# Altium integrated library WE-D-SUB_rev15a (1).intlib: 32 symbols
Pins are listed as number, name and electrical type; pins without a type are passive.

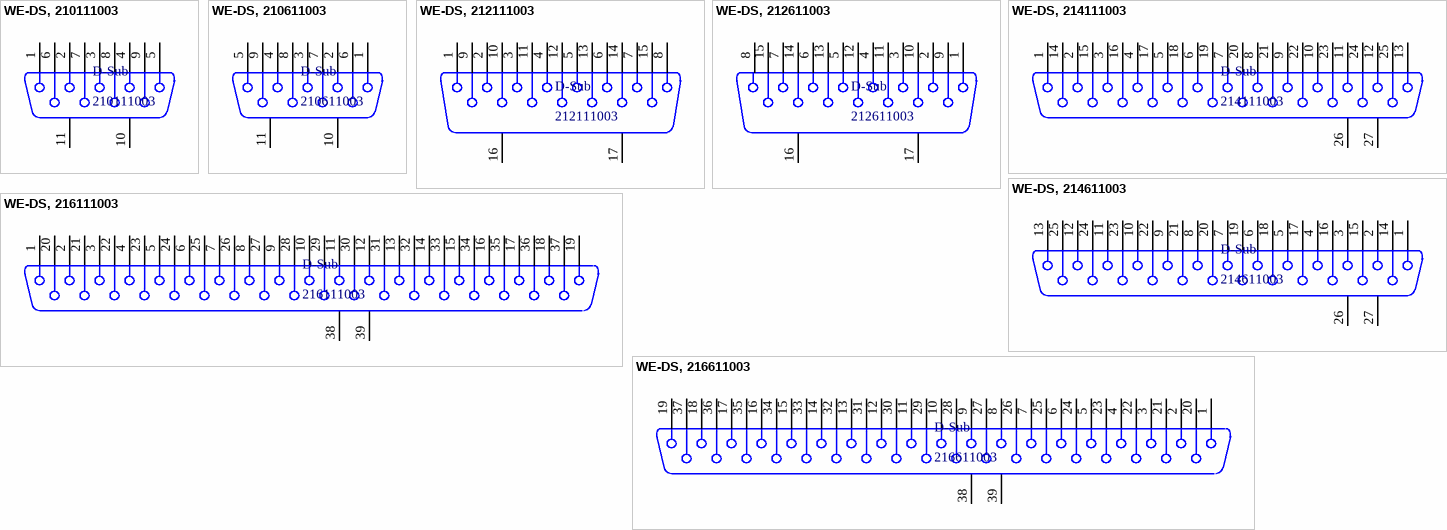
[diagram p0: symbols WE-DS, 210111003 to WE-DS, 216611003]

## WE-DS, 210111003
designator D-Sub, comment 210111003
D-SUB-Filter Connectors WE-DS, Solder Pin Straight; Manufacturer: Würth Elektronik eiSos GmbH; partNo: 210111003; ComponentLink1Description: Manufacturer; ComponentLink1URL: http://www.we-online.de; Created by: Christin Zierenner; Created Date: May 2012; ComponentLink2Description: Datasheet; ComponentLink2URL: http://katalog.we-online.de/kataloge/eisos/index.php?language=en&pf=Filter_gerade
footprint WE-DS, 210111003 (D-SUB- 9P, MALE, STRAIGHT, TH)
pins: 1, 2, 3, 4, 5, 6, 7, 8, 9, 10 MH1, 11 MH2

## WE-DS, 210611003
designator D-Sub, comment 210611003
D-SUB-Filter Connectors WE-DS, Solder Pin Straight; Manufacturer: Würth Elektronik eiSos GmbH; partNo: 210611003; ComponentLink1Description: Manufacturer; ComponentLink1URL: http://www.we-online.de; Created by: Christin Zierenner; Created Date: May 2012; ComponentLink2Description: Datasheet; ComponentLink2URL: http://katalog.we-online.de/kataloge/eisos/index.php?language=en&pf=Filter_gerade
footprint WE-DS, 210611003 (D-SUB- 9P, FEMALE, STRAIGHT, TH)
pins: 1, 2, 3, 4, 5, 6, 7, 8, 9, 10 MH1, 11 MH2

## WE-DS, 212111003
designator D-Sub, comment 212111003
D-SUB-Filter Connectors WE-DS, Solder Pin Straight; Manufacturer: Würth Elektronik eiSos GmbH; partNo: 212111003; ComponentLink1Description: Manufacturer; ComponentLink1URL: http://www.we-online.de; Created by: Christin Zierenner; Created Date: May 2012; ComponentLink2Description: Datasheet; ComponentLink2URL: http://katalog.we-online.de/kataloge/eisos/index.php?language=en&pf=Filter_gerade
footprint WE-DS, 212111003 (D-SUB- 15P, MALE, STRAIGHT, TH)
pins: 1, 2, 3, 4, 5, 6, 7, 8, 9, 10, 11, 12, 13, 14, 15, 16 MH1, 17 MH2

## WE-DS, 212611003
designator D-Sub, comment 212611003
D-SUB-Filter Connectors WE-DS, Solder Pin Straight; Manufacturer: Würth Elektronik eiSos GmbH; partNo: 212611003; ComponentLink1Description: Manufacturer; ComponentLink1URL: http://www.we-online.de; Created by: Christin Zierenner; Created Date: May 2012; ComponentLink2Description: Datasheet; ComponentLink2URL: http://katalog.we-online.de/kataloge/eisos/index.php?language=en&pf=Filter_gerade
footprint WE-DS, 212611003 (D-SUB- 15P, FEMALE, STRAIGHT, TH)
pins: 1, 2, 3, 4, 5, 6, 7, 8, 9, 10, 11, 12, 13, 14, 15, 16 MH1, 17 MH2

## WE-DS, 214111003
designator D-Sub, comment 214111003
D-SUB-Filter Connectors WE-DS, Solder Pin Straight; Manufacturer: Würth Elektronik eiSos GmbH; partNo: 214111003; ComponentLink1Description: Manufacturer; ComponentLink1URL: http://www.we-online.de; Created by: Christin Zierenner; Created Date: May 2012; ComponentLink2Description: Datasheet; ComponentLink2URL: http://katalog.we-online.de/kataloge/eisos/index.php?language=en&pf=Filter_gerade
footprint WE-DS, 214111003 (D-SUB- 25P, MALE, STRAIGHT, TH)
pins: 1, 2, 3, 4, 5, 6, 7, 8, 9, 10, 11, 12, 13, 14, 15, 16, 17, 18, 19, 20, 21, 22, 23, 24, 25, 26 MH1, 27 MH2

## WE-DS, 214611003
designator D-Sub, comment 214611003
D-SUB-Filter Connectors WE-DS, Solder Pin Straight; Manufacturer: Würth Elektronik eiSos GmbH; partNo: 214611003; ComponentLink1Description: Manufacturer; ComponentLink1URL: http://www.we-online.de; Created by: Christin Zierenner; Created Date: May 2012; ComponentLink2Description: Datasheet; ComponentLink2URL: http://katalog.we-online.de/kataloge/eisos/index.php?language=en&pf=Filter_gerade
footprint WE-DS, 214611003 (D-SUB- 25P, FEMALE, STRAIGHT, TH)
pins: 1, 2, 3, 4, 5, 6, 7, 8, 9, 10, 11, 12, 13, 14, 15, 16, 17, 18, 19, 20, 21, 22, 23, 24, 25, 26 MH1, 27 MH2

## WE-DS, 216111003
designator D-Sub, comment 216111003
D-SUB-Filter Connectors WE-DS, Solder Pin Straight; Manufacturer: Würth Elektronik eiSos GmbH; partNo: 216111003; ComponentLink1Description: Manufacturer; ComponentLink1URL: http://www.we-online.de; Created by: Christin Zierenner; Created Date: May 2012; ComponentLink2Description: Datasheet; ComponentLink2URL: http://katalog.we-online.de/kataloge/eisos/index.php?language=en&pf=Filter_gerade
footprint WE-DS, 216111003 (D-SUB- 37P, MALE, STRAIGHT, TH)
pins: 1, 2, 3, 4, 5, 6, 7, 8, 9, 10, 11, 12, 13, 14, 15, 16, 17, 18, 19, 20, 21, 22, 23, 24, 25, 26, 27, 28, 29, 30, 31, 32, 33, 34, 35, 36, 37, 38 MH1, 39 MH2

## WE-DS, 216611003
designator D-Sub, comment 216611003
D-SUB-Filter Connectors WE-DS, Solder Pin Straight; Manufacturer: Würth Elektronik eiSos GmbH; partNo: 216611003; ComponentLink1Description: Manufacturer; ComponentLink1URL: http://www.we-online.de; Created by: Christin Zierenner; Created Date: May 2012; ComponentLink2Description: Datasheet; ComponentLink2URL: http://katalog.we-online.de/kataloge/eisos/index.php?language=en&pf=Filter_gerade
footprint WE-DS, 216611003 (D-SUB- 37P, FEMALE, STRAIGHT, TH)
pins: 1, 2, 3, 4, 5, 6, 7, 8, 9, 10, 11, 12, 13, 14, 15, 16, 17, 18, 19, 20, 21, 22, 23, 24, 25, 26, 27, 28, 29, 30, 31, 32, 33, 34, 35, 36, 37, 38 MH1, 39 MH2


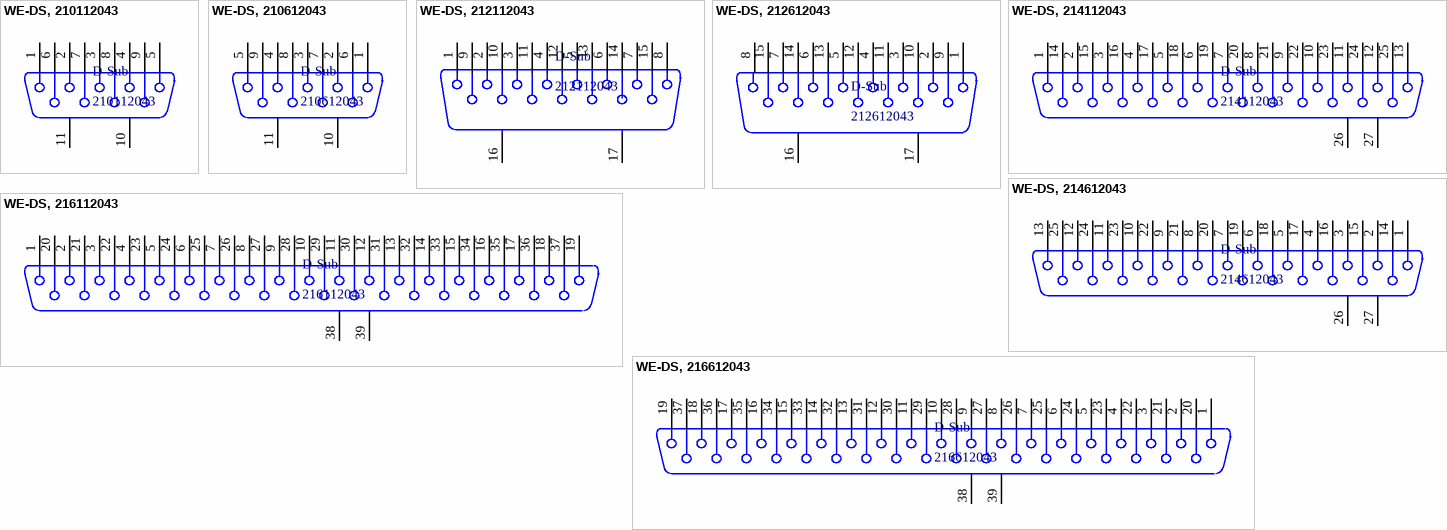
[diagram p1: symbols WE-DS, 210112043 to WE-DS, 216612043]

## WE-DS, 210112043
designator D-Sub, comment 210112043
D-SUB-Filter Connectors WE-DS, Bent 90°,TH; Manufacturer: Würth Elektronik eiSos GmbH; partNo: 210112043; ComponentLink1Description: Manufacturer; ComponentLink1URL: http://www.we-online.de; Created by: Christin Zierenner; Created Date: May 2012; ComponentLink2Description: Datasheet; ComponentLink2URL: http://katalog.we-online.de/kataloge/eisos/index.php?language=en&pf=Filter_abgewinkelt
footprint WE-DS, 210112043 (D-SUB- 9P, MALE, RT ANGLE, TH)
pins: 1, 2, 3, 4, 5, 6, 7, 8, 9, 10 MH1, 11 MH2

## WE-DS, 210612043
designator D-Sub, comment 210612043
D-SUB-Filter Connectors WE-DS, Bent 90°,TH; Manufacturer: Würth Elektronik eiSos GmbH; partNo: 210612043; ComponentLink1Description: Manufacturer; ComponentLink1URL: http://www.we-online.de; Created by: Christin Zierenner; Created Date: May 2012; ComponentLink2Description: Datasheet; ComponentLink2URL: http://katalog.we-online.de/kataloge/eisos/index.php?language=en&pf=Filter_abgewinkelt
footprint WE-DS, 210612043 (D-SUB- 9P, FEMALE, RT ANGLE, TH)
pins: 1, 2, 3, 4, 5, 6, 7, 8, 9, 10 MH1, 11 MH2

## WE-DS, 212112043
designator D-Sub, comment 212112043
D-SUB-Filter Connectors WE-DS, Bent 90°,TH; Manufacturer: Würth Elektronik eiSos GmbH; partNo: 212112043; ComponentLink1Description: Manufacturer; ComponentLink1URL: http://www.we-online.de; Created by: Christin Zierenner; Created Date: May 2012; ComponentLink2Description: Datasheet; ComponentLink2URL: http://katalog.we-online.de/kataloge/eisos/index.php?language=en&pf=Filter_abgewinkelt
footprint WE-DS, 212112043 (D-SUB- 15P, MALE, RT ANGLE, TH)
pins: 1, 2, 3, 4, 5, 6, 7, 8, 9, 10, 11, 12, 13, 14, 15, 16 MH1, 17 MH2

## WE-DS, 212612043
designator D-Sub, comment 212612043
D-SUB-Filter Connectors WE-DS, Bent 90°,TH; Manufacturer: Würth Elektronik eiSos GmbH; partNo: 212612043; ComponentLink1Description: Manufacturer; ComponentLink1URL: http://www.we-online.de; Created by: Christin Zierenner; Created Date: May 2012; ComponentLink2Description: Datasheet; ComponentLink2URL: http://katalog.we-online.de/kataloge/eisos/index.php?language=en&pf=Filter_abgewinkelt
footprint WE-DS, 212612043 (D-SUB- 15P, FEMALE, RT ANGLE, TH)
pins: 1, 2, 3, 4, 5, 6, 7, 8, 9, 10, 11, 12, 13, 14, 15, 16 MH1, 17 MH2

## WE-DS, 214112043
designator D-Sub, comment 214112043
D-SUB-Filter Connectors WE-DS, Bent 90°,TH; Manufacturer: Würth Elektronik eiSos GmbH; partNo: 214112043; ComponentLink1Description: Manufacturer; ComponentLink1URL: http://www.we-online.de; Created by: Christin Zierenner; Created Date: May 2012; ComponentLink2Description: Datasheet; ComponentLink2URL: http://katalog.we-online.de/kataloge/eisos/index.php?language=en&pf=Filter_abgewinkelt
footprint WE-DS, 214112043 (D-SUB- 25P, MALE, RT ANGLE, TH)
pins: 1, 2, 3, 4, 5, 6, 7, 8, 9, 10, 11, 12, 13, 14, 15, 16, 17, 18, 19, 20, 21, 22, 23, 24, 25, 26 MH1, 27 MH2

## WE-DS, 214612043
designator D-Sub, comment 214612043
D-SUB-Filter Connectors WE-DS, Bent 90°,TH; Manufacturer: Würth Elektronik eiSos GmbH; partNo: 214612043; ComponentLink1Description: Manufacturer; ComponentLink1URL: http://www.we-online.de; Created by: Christin Zierenner; Created Date: May 2012; ComponentLink2Description: Datasheet; ComponentLink2URL: http://katalog.we-online.de/kataloge/eisos/index.php?language=en&pf=Filter_abgewinkelt
footprint WE-DS, 214612043 (D-SUB- 25P, FEMALE, RT ANGLE, TH)
pins: 1, 2, 3, 4, 5, 6, 7, 8, 9, 10, 11, 12, 13, 14, 15, 16, 17, 18, 19, 20, 21, 22, 23, 24, 25, 26 MH1, 27 MH2

## WE-DS, 216112043
designator D-Sub, comment 216112043
D-SUB-Filter Connectors WE-DS, Bent 90°,TH; Manufacturer: Würth Elektronik eiSos GmbH; partNo: 216112043; ComponentLink1Description: Manufacturer; ComponentLink1URL: http://www.we-online.de; Created by: Christin Zierenner; Created Date: May 2012; ComponentLink2Description: Datasheet; ComponentLink2URL: http://katalog.we-online.de/kataloge/eisos/index.php?language=en&pf=Filter_abgewinkelt
footprint WE-DS, 216112043 (D-SUB- 37P, MALE, RT ANGLE, TH)
pins: 1, 2, 3, 4, 5, 6, 7, 8, 9, 10, 11, 12, 13, 14, 15, 16, 17, 18, 19, 20, 21, 22, 23, 24, 25, 26, 27, 28, 29, 30, 31, 32, 33, 34, 35, 36, 37, 38 MH1, 39 MH2

## WE-DS, 216612043
designator D-Sub, comment 216612043
D-SUB-Filter Connectors WE-DS, Bent 90°,TH; Manufacturer: Würth Elektronik eiSos GmbH; partNo: 216612043; ComponentLink1Description: Manufacturer; ComponentLink1URL: http://www.we-online.de; Created by: Christin Zierenner; Created Date: May 2012; ComponentLink2Description: Datasheet; ComponentLink2URL: http://katalog.we-online.de/kataloge/eisos/index.php?language=en&pf=Filter_abgewinkelt
footprint WE-DS, 216612043 (D-SUB- 37P, FEMALE, RT ANGLE, TH)
pins: 1, 2, 3, 4, 5, 6, 7, 8, 9, 10, 11, 12, 13, 14, 15, 16, 17, 18, 19, 20, 21, 22, 23, 24, 25, 26, 27, 28, 29, 30, 31, 32, 33, 34, 35, 36, 37, 38 MH1, 39 MH2


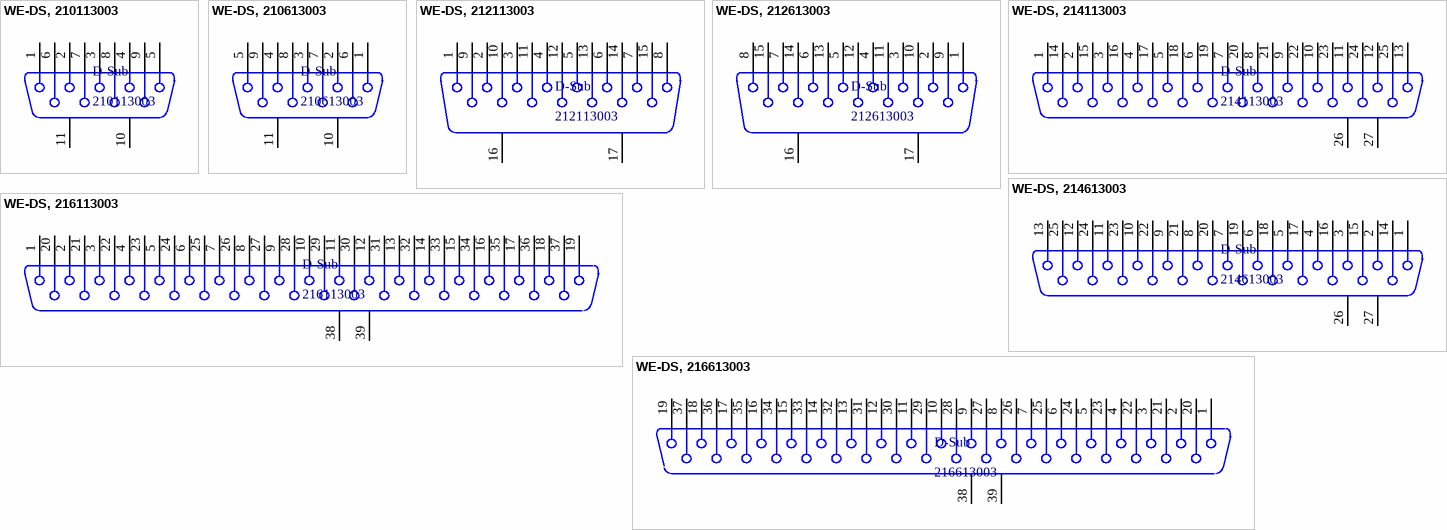
[diagram p2: symbols WE-DS, 210113003 to WE-DS, 216613003]

## WE-DS, 210113003
designator D-Sub, comment 210113003
D-SUB-Filter Connectors WE-DS, Solder Cup; Manufacturer: Würth Elektronik eiSos GmbH; partNo: 210113003; ComponentLink1Description: Manufacturer; ComponentLink1URL: http://www.we-online.de; Created by: Christin Zierenner; Created Date: May 2012; ComponentLink2Description: Datasheet; ComponentLink2URL: http://katalog.we-online.de/kataloge/eisos/index.php?language=en&pf=Filter_Loetkelch
footprint WE-DS, 210113003 (D-SUB- 9P, MALE, SOLDER BUCKET VERTICAL MOUNT, TH)
pins: 1, 2, 3, 4, 5, 6, 7, 8, 9, 10 MH1, 11 MH2

## WE-DS, 210613003
designator D-Sub, comment 210613003
D-SUB-Filter Connectors WE-DS, Solder Cup; Manufacturer: Würth Elektronik eiSos GmbH; partNo: 210613003; ComponentLink1Description: Manufacturer; ComponentLink1URL: http://www.we-online.de; Created by: Christin Zierenner; Created Date: May 2012; ComponentLink2Description: Datasheet; ComponentLink2URL: http://katalog.we-online.de/kataloge/eisos/index.php?language=en&pf=Filter_Loetkelch
footprint WE-DS, 210613003 (D-SUB- 9P, FEMALE, SOLDER BUCKET VERTICAL MOUNT, TH)
pins: 1, 2, 3, 4, 5, 6, 7, 8, 9, 10 MH1, 11 MH2

## WE-DS, 212113003
designator D-Sub, comment 212113003
D-SUB-Filter Connectors WE-DS, Solder Cup; Manufacturer: Würth Elektronik eiSos GmbH; partNo: 212113003; ComponentLink1Description: Manufacturer; ComponentLink1URL: http://www.we-online.de; Created by: Christin Zierenner; Created Date: May 2012; ComponentLink2Description: Datasheet; ComponentLink2URL: http://katalog.we-online.de/kataloge/eisos/index.php?language=en&pf=Filter_Loetkelch
footprint WE-DS, 212113003 (D-SUB- 15P, MALE, SOLDER BUCKET, TH)
pins: 1, 2, 3, 4, 5, 6, 7, 8, 9, 10, 11, 12, 13, 14, 15, 16 MH1, 17 MH2

## WE-DS, 212613003
designator D-Sub, comment 212613003
D-SUB-Filter Connectors WE-DS, Solder Cup; Manufacturer: Würth Elektronik eiSos GmbH; partNo: 212613003; ComponentLink1Description: Manufacturer; ComponentLink1URL: http://www.we-online.de; Created by: Christin Zierenner; Created Date: May 2012; ComponentLink2Description: Datasheet; ComponentLink2URL: http://katalog.we-online.de/kataloge/eisos/index.php?language=en&pf=Filter_Loetkelch
footprint WE-DS, 212613003 (D-SUB- 15P, FEMALE, SOLDER BUCKET, TH)
pins: 1, 2, 3, 4, 5, 6, 7, 8, 9, 10, 11, 12, 13, 14, 15, 16 MH1, 17 MH2

## WE-DS, 214113003
designator D-Sub, comment 214113003
D-SUB-Filter Connectors WE-DS, Solder Cup; Manufacturer: Würth Elektronik eiSos GmbH; partNo: 214113003; ComponentLink1Description: Manufacturer; ComponentLink1URL: http://www.we-online.de; Created by: Christin Zierenner; Created Date: May 2012; ComponentLink2Description: Datasheet; ComponentLink2URL: http://katalog.we-online.de/kataloge/eisos/index.php?language=en&pf=Filter_Loetkelch
footprint WE-DS, 214113003 (D-SUB- 25P, MALE, SOLDER BUCKET,TH)
pins: 1, 2, 3, 4, 5, 6, 7, 8, 9, 10, 11, 12, 13, 14, 15, 16, 17, 18, 19, 20, 21, 22, 23, 24, 25, 26 MH1, 27 MH2

## WE-DS, 214613003
designator D-Sub, comment 214613003
D-SUB-Filter Connectors WE-DS, Solder Cup; Manufacturer: Würth Elektronik eiSos GmbH; partNo: 214613003; ComponentLink1Description: Manufacturer; ComponentLink1URL: http://www.we-online.de; Created by: Christin Zierenner; Created Date: May 2012; ComponentLink2Description: Datasheet; ComponentLink2URL: http://katalog.we-online.de/kataloge/eisos/index.php?language=en&pf=Filter_Loetkelch
footprint WE-DS, 214613003 (D-SUB- 25P, FEMALE, SOLDER BUCKET, TH)
pins: 1, 2, 3, 4, 5, 6, 7, 8, 9, 10, 11, 12, 13, 14, 15, 16, 17, 18, 19, 20, 21, 22, 23, 24, 25, 26 MH1, 27 MH2

## WE-DS, 216113003
designator D-Sub, comment 216113003
D-SUB-Filter Connectors WE-DS, Solder Cup; Manufacturer: Würth Elektronik eiSos GmbH; partNo: 216113003; ComponentLink1Description: Manufacturer; ComponentLink1URL: http://www.we-online.de; Created by: Christin Zierenner; Created Date: May 2012; ComponentLink2Description: Datasheet; ComponentLink2URL: http://katalog.we-online.de/kataloge/eisos/index.php?language=en&pf=Filter_Loetkelch
footprint WE-DS, 216113003 (D-SUB- 37P, MALE, SOLDER BUCKET, TH)
pins: 1, 2, 3, 4, 5, 6, 7, 8, 9, 10, 11, 12, 13, 14, 15, 16, 17, 18, 19, 20, 21, 22, 23, 24, 25, 26, 27, 28, 29, 30, 31, 32, 33, 34, 35, 36, 37, 38 MH1, 39 MH2

## WE-DS, 216613003
designator D-Sub, comment 216613003
D-SUB-Filter Connectors WE-DS, Solder Cup; Manufacturer: Würth Elektronik eiSos GmbH; partNo: 216613003; ComponentLink1Description: Manufacturer; ComponentLink1URL: http://www.we-online.de; Created by: Christin Zierenner; Created Date: May 2012; ComponentLink2Description: Datasheet; ComponentLink2URL: http://katalog.we-online.de/kataloge/eisos/index.php?language=en&pf=Filter_Loetkelch
footprint WE-DS, 216613003 (D-SUB- 37P, FEMALE, SOLDER BUCKET, TH)
pins: 1, 2, 3, 4, 5, 6, 7, 8, 9, 10, 11, 12, 13, 14, 15, 16, 17, 18, 19, 20, 21, 22, 23, 24, 25, 26, 27, 28, 29, 30, 31, 32, 33, 34, 35, 36, 37, 38 MH1, 39 MH2


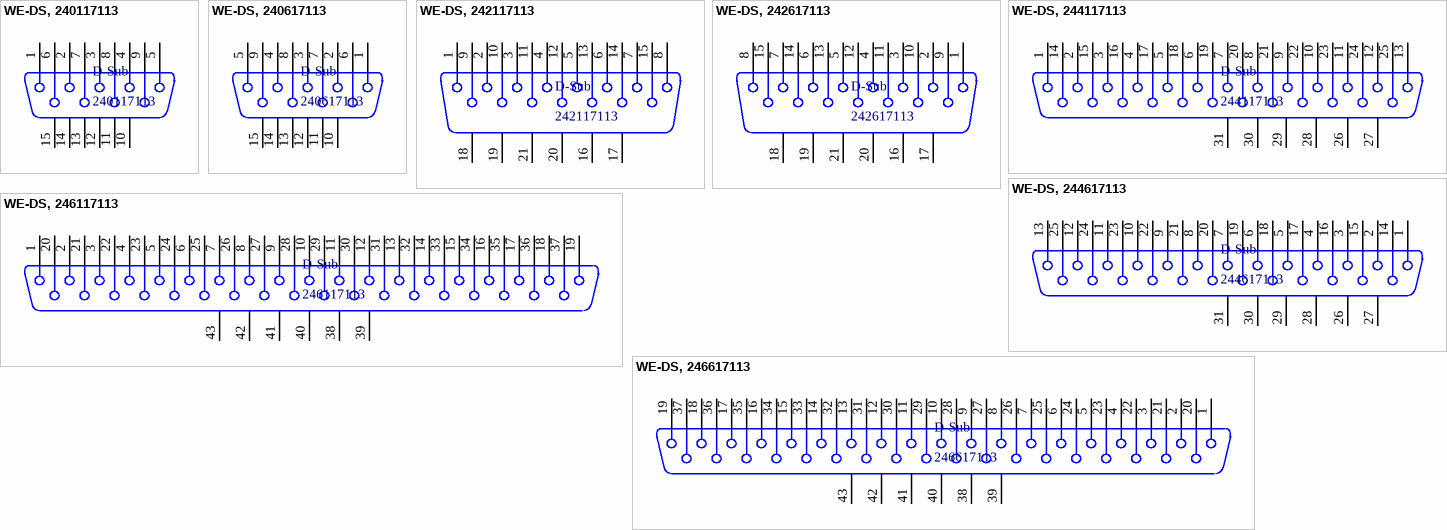
[diagram p3: symbols WE-DS, 240117113 to WE-DS, 246617113]

## WE-DS, 240117113
designator D-Sub, comment 240117113
D-SUB-Filter Connectors WE-DS, Bent 90°,SMT; Manufacturer: Würth Elektronik eiSos GmbH; partNo: 240117113; ComponentLink1Description: Manufacturer; ComponentLink1URL: http://www.we-online.de; Created by: Christin Zierenner; Created Date: May 2012; ComponentLink2Description: Datasheet; ComponentLink2URL: http://katalog.we-online.de/kataloge/eisos/index.php?language=en&pf=Filter_SMD
footprint WE-DS, 240117113 (D-SUB- 9P, MALE, RT ANGLE, SMT)
pins: 1, 2, 3, 4, 5, 6, 7, 8, 9, 10 MH1, 11 MH2, 12 MH3, 13 MH4, 14 MH5, 15 MH6

## WE-DS, 240617113
designator D-Sub, comment 240617113
D-SUB-Filter Connectors WE-DS, Bent 90°,SMT; Manufacturer: Würth Elektronik eiSos GmbH; partNo: 240617113; ComponentLink1Description: Manufacturer; ComponentLink1URL: http://www.we-online.de; Created by: Christin Zierenner; Created Date: May 2012; ComponentLink2Description: Datasheet; ComponentLink2URL: http://katalog.we-online.de/kataloge/eisos/index.php?language=en&pf=Filter_SMD
footprint WE-DS, 240617113 (D-SUB- 9P, FEMALE, RT ANGLE, SMT)
pins: 1, 2, 3, 4, 5, 6, 7, 8, 9, 10 MH1, 11 MH2, 12 MH3, 13 MH4, 14 MH5, 15 MH6

## WE-DS, 242117113
designator D-Sub, comment 242117113
D-SUB-Filter Connectors WE-DS, Bent 90°,SMT; Manufacturer: Würth Elektronik eiSos GmbH; partNo: 242117113; ComponentLink1Description: Manufacturer; ComponentLink1URL: http://www.we-online.de; Created by: Christin Zierenner; Created Date: May 2012; ComponentLink2Description: Datasheet; ComponentLink2URL: http://katalog.we-online.de/kataloge/eisos/index.php?language=en&pf=Filter_SMD
footprint WE-DS, 242117113 (D-SUB- 15P, MALE, RT ANGLE, SMT)
pins: 1, 2, 3, 4, 5, 6, 7, 8, 9, 10, 11, 12, 13, 14, 15, 16 MH1, 17 MH2, 18 MH3, 19 MH4, 20 MH5, 21 MH6

## WE-DS, 242617113
designator D-Sub, comment 242617113
D-SUB-Filter Connectors WE-DS, Bent 90°,SMT; Manufacturer: Würth Elektronik eiSos GmbH; partNo: 242617113; ComponentLink1Description: Manufacturer; ComponentLink1URL: http://www.we-online.de; Created by: Christin Zierenner; Created Date: May 2012; ComponentLink2Description: Datasheet; ComponentLink2URL: http://katalog.we-online.de/kataloge/eisos/index.php?language=en&pf=Filter_SMD
footprint WE-DS, 242617113 (D-SUB- 15P, FEMALE, RT ANGLE, SMT)
pins: 1, 2, 3, 4, 5, 6, 7, 8, 9, 10, 11, 12, 13, 14, 15, 16 MH1, 17 MH2, 18 MH3, 19 MH4, 20 MH5, 21 MH6

## WE-DS, 244117113
designator D-Sub, comment 244117113
D-SUB-Filter Connectors WE-DS, Bent 90°,SMT; Manufacturer: Würth Elektronik eiSos GmbH; partNo: 244117113; ComponentLink1Description: Manufacturer; ComponentLink1URL: http://www.we-online.de; Created by: Christin Zierenner; Created Date: May 2012; ComponentLink2Description: Datasheet; ComponentLink2URL: http://katalog.we-online.de/kataloge/eisos/index.php?language=en&pf=Filter_SMD
footprint WE-DS, 244117113 (D-SUB- 25P, MALE, RT ANGLE, SMT)
pins: 1, 2, 3, 4, 5, 6, 7, 8, 9, 10, 11, 12, 13, 14, 15, 16, 17, 18, 19, 20, 21, 22, 23, 24, 25, 26 MH1, 27 MH2, 28 MH3, 29 MH4, 30 MH5, 31 MH5

## WE-DS, 244617113
designator D-Sub, comment 244617113
D-SUB-Filter Connectors WE-DS, Bent 90°,SMT; Manufacturer: Würth Elektronik eiSos GmbH; partNo: 244617113; ComponentLink1Description: Manufacturer; ComponentLink1URL: http://www.we-online.de; Created by: Christin Zierenner; Created Date: May 2012; ComponentLink2Description: Datasheet; ComponentLink2URL: http://katalog.we-online.de/kataloge/eisos/index.php?language=en&pf=Filter_SMD
footprint WE-DS, 244617113 (D-SUB- 25P, FEMALE, RT ANGLE, SMT)
pins: 1, 2, 3, 4, 5, 6, 7, 8, 9, 10, 11, 12, 13, 14, 15, 16, 17, 18, 19, 20, 21, 22, 23, 24, 25, 26 MH1, 27 MH2, 28 MH3, 29 MH4, 30 MH5, 31 MH5

## WE-DS, 246117113
designator D-Sub, comment 246117113
D-SUB-Filter Connectors WE-DS, Bent 90°,SMT; Manufacturer: Würth Elektronik eiSos GmbH; partNo: 246117113; ComponentLink1Description: Manufacturer; ComponentLink1URL: http://www.we-online.de; Created by: Christin Zierenner; Created Date: May 2012; ComponentLink2Description: Datasheet; ComponentLink2URL: http://katalog.we-online.de/kataloge/eisos/index.php?language=en&pf=Filter_SMD
footprint WE-DS, 246117113 (D-SUB- 37P, MALE, RT ANGLE, SMT)
pins: 1, 2, 3, 4, 5, 6, 7, 8, 9, 10, 11, 12, 13, 14, 15, 16, 17, 18, 19, 20, 21, 22, 23, 24, 25, 26, 27, 28, 29, 30, 31, 32, 33, 34, 35, 36, 37, 38 MH1, 39 MH2, 40 MH3, 41 MH4, 42 MH5, 43 MH5

## WE-DS, 246617113
designator D-Sub, comment 246617113
D-SUB-Filter Connectors WE-DS, Bent 90°,SMT; Manufacturer: Würth Elektronik eiSos GmbH; partNo: 246617113; ComponentLink1Description: Manufacturer; ComponentLink1URL: http://www.we-online.de; Created by: Christin Zierenner; Created Date: May 2012; ComponentLink2Description: Datasheet; ComponentLink2URL: http://katalog.we-online.de/kataloge/eisos/index.php?language=en&pf=Filter_SMD
footprint WE-DS, 246617113 (D-SUB- 37P, FEMALE, RT ANGLE, SMT)
pins: 1, 2, 3, 4, 5, 6, 7, 8, 9, 10, 11, 12, 13, 14, 15, 16, 17, 18, 19, 20, 21, 22, 23, 24, 25, 26, 27, 28, 29, 30, 31, 32, 33, 34, 35, 36, 37, 38 MH1, 39 MH2, 40 MH3, 41 MH4, 42 MH5, 43 MH5